# Altium footprint library smd-ipc.PCBLIB: 363 footprints (part 15 of 27) (continued)
## SQFP-R-07X10-92 [mm] (continued)
  rectangle: -6.1,-1.12 -4.95,-0.98
  rectangle: -6.1,-1.42 -4.95,-1.28
  rectangle: -6.1,-1.72 -4.95,-1.58
  rectangle: -6.1,-2.02 -4.95,-1.88
  rectangle: -6.1,-2.32 -4.95,-2.18
  rectangle: -6.1,-2.62 -4.95,-2.48
  lines w0.203: -4.9,-3.4 4.9,-3.4 4.9,3.4 -4.9,3.4 -4.9,-3.4
Mechanical 27:
  lines w0.2: -6.9,-5.4 -6.9,5.4 6.9,5.4 6.9,-5.4 -6.9,-5.4

## SQFP-R-07X10-100 [mm]
pads (100):
  rect 0.17x1.6 smd: 1(-4.35,-4.1) 2(-4.05,-4.1) 3(-3.75,-4.1) 4(-3.45,-4.1) 5(-3.15,-4.1) 6(-2.85,-4.1) 7(-2.55,-4.1) 8(-2.25,-4.1) 9(-1.95,-4.1) 10(-1.65,-4.1) 11(-1.35,-4.1) 12(-1.05,-4.1) 13(-0.75,-4.1) 14(-0.45,-4.1) 15(-0.15,-4.1) 16(0.15,-4.1) 17(0.45,-4.1) 18(0.75,-4.1) 19(1.05,-4.1) 20(1.35,-4.1) 21(1.65,-4.1) 22(1.95,-4.1) 23(2.25,-4.1) 24(2.55,-4.1) 25(2.85,-4.1) 26(3.15,-4.1) 27(3.45,-4.1) 28(3.75,-4.1) 29(4.05,-4.1) 30(4.35,-4.1) 51(4.35,4.1) 52(4.05,4.1) 53(3.75,4.1) 54(3.45,4.1) 55(3.15,4.1) 56(2.85,4.1) 57(2.55,4.1) 58(2.25,4.1) 59(1.95,4.1) 60(1.65,4.1) 61(1.35,4.1) 62(1.05,4.1) 63(0.75,4.1) 64(0.45,4.1) 65(0.15,4.1) 66(-0.15,4.1) 67(-0.45,4.1) 68(-0.75,4.1) 69(-1.05,4.1) 70(-1.35,4.1) 71(-1.65,4.1) 72(-1.95,4.1) 73(-2.25,4.1) 74(-2.55,4.1) 75(-2.85,4.1) 76(-3.15,4.1) 77(-3.45,4.1) 78(-3.75,4.1) 79(-4.05,4.1) 80(-4.35,4.1)
  rect 1.6x0.17 smd: 31(5.6,-2.85) 32(5.6,-2.55) 33(5.6,-2.25) 34(5.6,-1.95) 35(5.6,-1.65) 36(5.6,-1.35) 37(5.6,-1.05) 38(5.6,-0.75) 39(5.6,-0.45) 40(5.6,-0.15) 41(5.6,0.15) 42(5.6,0.45) 43(5.6,0.75) 44(5.6,1.05) 45(5.6,1.35) 46(5.6,1.65) 47(5.6,1.95) 48(5.6,2.25) 49(5.6,2.55) 50(5.6,2.85) 81(-5.6,2.85) 82(-5.6,2.55) 83(-5.6,2.25) 84(-5.6,1.95) 85(-5.6,1.65) 86(-5.6,1.35) 87(-5.6,1.05) 88(-5.6,0.75) 89(-5.6,0.45) 90(-5.6,0.15) 91(-5.6,-0.15) 92(-5.6,-0.45) 93(-5.6,-0.75) 94(-5.6,-1.05) 95(-5.6,-1.35) 96(-5.6,-1.65) 97(-5.6,-1.95) 98(-5.6,-2.25) 99(-5.6,-2.55) 100(-5.6,-2.85)
Top Overlay:
  circle w0.254: c-3.5,-2 r0.75
  lines w0.203: -4.57,-3.06 4.56,-3.06 4.56,3.06 -4.57,3.06 -4.57,-3.06
Mechanical 16:
  rectangle: -4.42,-4.6 -4.28,-3.45
  rectangle: 4.95,-2.92 6.1,-2.78
  rectangle: -4.12,-4.6 -3.98,-3.45
  rectangle: -3.82,-4.6 -3.68,-3.45
  rectangle: -3.52,-4.6 -3.38,-3.45
  rectangle: -3.22,-4.6 -3.08,-3.45
  rectangle: -2.92,-4.6 -2.78,-3.45
  rectangle: -2.62,-4.6 -2.48,-3.45
  rectangle: -2.32,-4.6 -2.18,-3.45
  rectangle: -2.02,-4.6 -1.88,-3.45
  rectangle: -1.72,-4.6 -1.58,-3.45
  rectangle: -1.42,-4.6 -1.28,-3.45
  rectangle: -1.12,-4.6 -0.98,-3.45
  rectangle: -0.82,-4.6 -0.68,-3.45
  rectangle: -0.52,-4.6 -0.38,-3.45
  rectangle: -0.22,-4.6 -0.08,-3.45
  rectangle: 0.08,-4.6 0.22,-3.45
  rectangle: 0.38,-4.6 0.52,-3.45
  rectangle: 0.68,-4.6 0.82,-3.45
  rectangle: 0.98,-4.6 1.12,-3.45
  rectangle: 1.28,-4.6 1.42,-3.45
  rectangle: 1.58,-4.6 1.72,-3.45
  rectangle: 1.88,-4.6 2.02,-3.45
  rectangle: 2.18,-4.6 2.32,-3.45
  rectangle: 2.48,-4.6 2.62,-3.45
  rectangle: 2.78,-4.6 2.92,-3.45
  rectangle: 3.08,-4.6 3.22,-3.45
  rectangle: 3.38,-4.6 3.52,-3.45
  rectangle: 3.68,-4.6 3.82,-3.45
  rectangle: 3.98,-4.6 4.12,-3.45
  rectangle: 4.28,-4.6 4.42,-3.45
  rectangle: 4.95,-2.62 6.1,-2.48
  rectangle: 4.95,-2.32 6.1,-2.18
  rectangle: 4.95,-2.02 6.1,-1.88
  rectangle: 4.95,-1.72 6.1,-1.58
  rectangle: 4.95,-1.42 6.1,-1.28
  rectangle: 4.95,-1.12 6.1,-0.98
  rectangle: 4.95,-0.82 6.1,-0.68
  rectangle: 4.95,-0.52 6.1,-0.38
  rectangle: 4.95,-0.22 6.1,-0.08
  rectangle: 4.95,0.08 6.1,0.22
  rectangle: 4.95,0.38 6.1,0.52
  rectangle: 4.95,0.68 6.1,0.82
  rectangle: 4.95,0.98 6.1,1.12
  rectangle: 4.95,1.28 6.1,1.42
  rectangle: 4.95,1.58 6.1,1.72
  rectangle: 4.95,1.88 6.1,2.02
  rectangle: 4.95,2.18 6.1,2.32
  rectangle: 4.95,2.48 6.1,2.62
  rectangle: 4.95,2.78 6.1,2.92
  rectangle: 4.28,3.45 4.42,4.6
  rectangle: 3.98,3.45 4.12,4.6
  rectangle: 3.68,3.45 3.82,4.6
  rectangle: 3.38,3.45 3.52,4.6
  rectangle: 3.08,3.45 3.22,4.6
  rectangle: 2.78,3.45 2.92,4.6
  rectangle: 2.48,3.45 2.62,4.6
  rectangle: 2.18,3.45 2.32,4.6
  rectangle: 1.88,3.45 2.02,4.6
  rectangle: 1.58,3.45 1.72,4.6
  rectangle: 1.28,3.45 1.42,4.6
  rectangle: 0.98,3.45 1.12,4.6
  rectangle: 0.68,3.45 0.82,4.6
  rectangle: 0.38,3.45 0.52,4.6
  rectangle: 0.08,3.45 0.22,4.6
  rectangle: -0.22,3.45 -0.08,4.6
  rectangle: -0.52,3.45 -0.38,4.6
  rectangle: -0.82,3.45 -0.68,4.6
  rectangle: -1.12,3.45 -0.98,4.6
  rectangle: -1.42,3.45 -1.28,4.6
  rectangle: -1.72,3.45 -1.58,4.6
  rectangle: -2.02,3.45 -1.88,4.6
  rectangle: -2.32,3.45 -2.18,4.6
  rectangle: -2.62,3.45 -2.48,4.6
  rectangle: -2.92,3.45 -2.78,4.6
  rectangle: -3.22,3.45 -3.08,4.6
  rectangle: -3.52,3.45 -3.38,4.6
  rectangle: -3.82,3.45 -3.68,4.6
  rectangle: -4.12,3.45 -3.98,4.6
  rectangle: -4.42,3.45 -4.28,4.6
  rectangle: -6.1,2.78 -4.95,2.92
  rectangle: -6.1,2.48 -4.95,2.62
  rectangle: -6.1,2.18 -4.95,2.32
  rectangle: -6.1,1.88 -4.95,2.02
  rectangle: -6.1,1.58 -4.95,1.72
  rectangle: -6.1,1.28 -4.95,1.42
  rectangle: -6.1,0.98 -4.95,1.12
  rectangle: -6.1,0.68 -4.95,0.82
  rectangle: -6.1,0.38 -4.95,0.52
  rectangle: -6.1,0.08 -4.95,0.22
  rectangle: -6.1,-0.22 -4.95,-0.08
  rectangle: -6.1,-0.52 -4.95,-0.38
  rectangle: -6.1,-0.82 -4.95,-0.68
  rectangle: -6.1,-1.12 -4.95,-0.98
  rectangle: -6.1,-1.42 -4.95,-1.28
  rectangle: -6.1,-1.72 -4.95,-1.58
  rectangle: -6.1,-2.02 -4.95,-1.88
  rectangle: -6.1,-2.32 -4.95,-2.18
  rectangle: -6.1,-2.62 -4.95,-2.48
  rectangle: -6.1,-2.92 -4.95,-2.78
  lines w0.203: -4.9,-3.4 4.9,-3.4 4.9,3.4 -4.9,3.4 -4.9,-3.4
Mechanical 27:
  lines w0.2: -6.9,-5.4 -6.9,5.4 6.9,5.4 6.9,-5.4 -6.9,-5.4

## SQFP-R-10X14-80 [mm]
pads (80):
  rect 0.3x1.6 smd: 1(-5.75,-5.6) 2(-5.25,-5.6) 3(-4.75,-5.6) 4(-4.25,-5.6) 5(-3.75,-5.6) 6(-3.25,-5.6) 7(-2.75,-5.6) 8(-2.25,-5.6) 9(-1.75,-5.6) 10(-1.25,-5.6) 11(-0.75,-5.6) 12(-0.25,-5.6) 13(0.25,-5.6) 14(0.75,-5.6) 15(1.25,-5.6) 16(1.75,-5.6) 17(2.25,-5.6) 18(2.75,-5.6) 19(3.25,-5.6) 20(3.75,-5.6) 21(4.25,-5.6) 22(4.75,-5.6) 23(5.25,-5.6) 24(5.75,-5.6) 41(5.75,5.6) 42(5.25,5.6) 43(4.75,5.6) 44(4.25,5.6) 45(3.75,5.6) 46(3.25,5.6) 47(2.75,5.6) 48(2.25,5.6) 49(1.75,5.6) 50(1.25,5.6) 51(0.75,5.6) 52(0.25,5.6) 53(-0.25,5.6) 54(-0.75,5.6) 55(-1.25,5.6) 56(-1.75,5.6) 57(-2.25,5.6) 58(-2.75,5.6) 59(-3.25,5.6) 60(-3.75,5.6) 61(-4.25,5.6) 62(-4.75,5.6) 63(-5.25,5.6) 64(-5.75,5.6)
  rect 1.6x0.3 smd: 25(7.6,-3.75) 26(7.6,-3.25) 27(7.6,-2.75) 28(7.6,-2.25) 29(7.6,-1.75) 30(7.6,-1.25) 31(7.6,-0.75) 32(7.6,-0.25) 33(7.6,0.25) 34(7.6,0.75) 35(7.6,1.25) 36(7.6,1.75) 37(7.6,2.25) 38(7.6,2.75) 39(7.6,3.25) 40(7.6,3.75) 65(-7.6,3.75) 66(-7.6,3.25) 67(-7.6,2.75) 68(-7.6,2.25) 69(-7.6,1.75) 70(-7.6,1.25) 71(-7.6,0.75) 72(-7.6,0.25) 73(-7.6,-0.25) 74(-7.6,-0.75) 75(-7.6,-1.25) 76(-7.6,-1.75) 77(-7.6,-2.25) 78(-7.6,-2.75) 79(-7.6,-3.25) 80(-7.6,-3.75)
Top Overlay:
  circle w0.254: c-5.5,-3.5 r0.75
  lines w0.203: -6.57,-4.56 6.56,-4.56 6.56,4.56 -6.57,4.56 -6.57,-4.56
Mechanical 16:
  rectangle: -5.9,-6.1 -5.6,-4.95
  rectangle: 6.95,-3.9 8.1,-3.6
  rectangle: -5.4,-6.1 -5.1,-4.95
  rectangle: -4.9,-6.1 -4.6,-4.95
  rectangle: -4.4,-6.1 -4.1,-4.95
  rectangle: -3.9,-6.1 -3.6,-4.95
  rectangle: -3.4,-6.1 -3.1,-4.95
  rectangle: -2.9,-6.1 -2.6,-4.95
  rectangle: -2.4,-6.1 -2.1,-4.95
  rectangle: -1.9,-6.1 -1.6,-4.95
  rectangle: -1.4,-6.1 -1.1,-4.95
  rectangle: -0.9,-6.1 -0.6,-4.95
  rectangle: -0.4,-6.1 -0.1,-4.95
  rectangle: 0.1,-6.1 0.4,-4.95
  rectangle: 0.6,-6.1 0.9,-4.95
  rectangle: 1.1,-6.1 1.4,-4.95
  rectangle: 1.6,-6.1 1.9,-4.95
  rectangle: 2.1,-6.1 2.4,-4.95
  rectangle: 2.6,-6.1 2.9,-4.95
  rectangle: 3.1,-6.1 3.4,-4.95
  rectangle: 3.6,-6.1 3.9,-4.95
  rectangle: 4.1,-6.1 4.4,-4.95
  rectangle: 4.6,-6.1 4.9,-4.95
  rectangle: 5.1,-6.1 5.4,-4.95
  rectangle: 5.6,-6.1 5.9,-4.95
  rectangle: 6.95,-3.4 8.1,-3.1
  rectangle: 6.95,-2.9 8.1,-2.6
  rectangle: 6.95,-2.4 8.1,-2.1
  rectangle: 6.95,-1.9 8.1,-1.6
  rectangle: 6.95,-1.4 8.1,-1.1
  rectangle: 6.95,-0.9 8.1,-0.6
  rectangle: 6.95,-0.4 8.1,-0.1
  rectangle: 6.95,0.1 8.1,0.4
  rectangle: 6.95,0.6 8.1,0.9
  rectangle: 6.95,1.1 8.1,1.4
  rectangle: 6.95,1.6 8.1,1.9
  rectangle: 6.95,2.1 8.1,2.4
  rectangle: 6.95,2.6 8.1,2.9
  rectangle: 6.95,3.1 8.1,3.4
  rectangle: 6.95,3.6 8.1,3.9
  rectangle: 5.6,4.95 5.9,6.1
  rectangle: 5.1,4.95 5.4,6.1
  rectangle: 4.6,4.95 4.9,6.1
  rectangle: 4.1,4.95 4.4,6.1
  rectangle: 3.6,4.95 3.9,6.1
  rectangle: 3.1,4.95 3.4,6.1
  rectangle: 2.6,4.95 2.9,6.1
  rectangle: 2.1,4.95 2.4,6.1
  rectangle: 1.6,4.95 1.9,6.1
  rectangle: 1.1,4.95 1.4,6.1
  rectangle: 0.6,4.95 0.9,6.1
  rectangle: 0.1,4.95 0.4,6.1
  rectangle: -0.4,4.95 -0.1,6.1
  rectangle: -0.9,4.95 -0.6,6.1
  rectangle: -1.4,4.95 -1.1,6.1
  rectangle: -1.9,4.95 -1.6,6.1
  rectangle: -2.4,4.95 -2.1,6.1
  rectangle: -2.9,4.95 -2.6,6.1
  rectangle: -3.4,4.95 -3.1,6.1
  rectangle: -3.9,4.95 -3.6,6.1
  rectangle: -4.4,4.95 -4.1,6.1
  rectangle: -4.9,4.95 -4.6,6.1
  rectangle: -5.4,4.95 -5.1,6.1
  rectangle: -5.9,4.95 -5.6,6.1
  rectangle: -8.1,3.6 -6.95,3.9
  rectangle: -8.1,3.1 -6.95,3.4
  rectangle: -8.1,2.6 -6.95,2.9
  rectangle: -8.1,2.1 -6.95,2.4
  rectangle: -8.1,1.6 -6.95,1.9
  rectangle: -8.1,1.1 -6.95,1.4
  rectangle: -8.1,0.6 -6.95,0.9
  rectangle: -8.1,0.1 -6.95,0.4
  rectangle: -8.1,-0.4 -6.95,-0.1
  rectangle: -8.1,-0.9 -6.95,-0.6
  rectangle: -8.1,-1.4 -6.95,-1.1
  rectangle: -8.1,-1.9 -6.95,-1.6
  rectangle: -8.1,-2.4 -6.95,-2.1
  rectangle: -8.1,-2.9 -6.95,-2.6
  rectangle: -8.1,-3.4 -6.95,-3.1
  rectangle: -8.1,-3.9 -6.95,-3.6
  lines w0.203: -6.9,-4.9 6.9,-4.9 6.9,4.9 -6.9,4.9 -6.9,-4.9
Mechanical 27:
  lines w0.2: -8.9,-6.9 -8.9,6.9 8.9,6.9 8.9,-6.9 -8.9,-6.9

## SQFP-R-10X14-88 [mm]
pads (88):
  rect 0.3x1.6 smd: 1(-6.25,-5.6) 2(-5.75,-5.6) 3(-5.25,-5.6) 4(-4.75,-5.6) 5(-4.25,-5.6) 6(-3.75,-5.6) 7(-3.25,-5.6) 8(-2.75,-5.6) 9(-2.25,-5.6) 10(-1.75,-5.6) 11(-1.25,-5.6) 12(-0.75,-5.6) 13(-0.25,-5.6) 14(0.25,-5.6) 15(0.75,-5.6) 16(1.25,-5.6) 17(1.75,-5.6) 18(2.25,-5.6) 19(2.75,-5.6) 20(3.25,-5.6) 21(3.75,-5.6) 22(4.25,-5.6) 23(4.75,-5.6) 24(5.25,-5.6) 25(5.75,-5.6) 26(6.25,-5.6) 45(6.25,5.6) 46(5.75,5.6) 47(5.25,5.6) 48(4.75,5.6) 49(4.25,5.6) 50(3.75,5.6) 51(3.25,5.6) 52(2.75,5.6) 53(2.25,5.6) 54(1.75,5.6) 55(1.25,5.6) 56(0.75,5.6) 57(0.25,5.6) 58(-0.25,5.6) 59(-0.75,5.6) 60(-1.25,5.6) 61(-1.75,5.6) 62(-2.25,5.6) 63(-2.75,5.6) 64(-3.25,5.6) 65(-3.75,5.6) 66(-4.25,5.6) 67(-4.75,5.6) 68(-5.25,5.6) 69(-5.75,5.6) 70(-6.25,5.6)
  rect 1.6x0.3 smd: 27(7.6,-4.25) 28(7.6,-3.75) 29(7.6,-3.25) 30(7.6,-2.75) 31(7.6,-2.25) 32(7.6,-1.75) 33(7.6,-1.25) 34(7.6,-0.75) 35(7.6,-0.25) 36(7.6,0.25) 37(7.6,0.75) 38(7.6,1.25) 39(7.6,1.75) 40(7.6,2.25) 41(7.6,2.75) 42(7.6,3.25) 43(7.6,3.75) 44(7.6,4.25) 71(-7.6,4.25) 72(-7.6,3.75) 73(-7.6,3.25) 74(-7.6,2.75) 75(-7.6,2.25) 76(-7.6,1.75) 77(-7.6,1.25) 78(-7.6,0.75) 79(-7.6,0.25) 80(-7.6,-0.25) 81(-7.6,-0.75) 82(-7.6,-1.25) 83(-7.6,-1.75) 84(-7.6,-2.25) 85(-7.6,-2.75) 86(-7.6,-3.25) 87(-7.6,-3.75) 88(-7.6,-4.25)
Top Overlay:
  circle w0.254: c-5.5,-3.5 r0.75
  lines w0.203: -6.57,-4.56 6.56,-4.56 6.56,4.56 -6.57,4.56 -6.57,-4.56
Mechanical 16:
  rectangle: -6.4,-6.1 -6.1,-4.95
  rectangle: 6.95,-4.4 8.1,-4.1
  rectangle: -5.9,-6.1 -5.6,-4.95
  rectangle: -5.4,-6.1 -5.1,-4.95
  rectangle: -4.9,-6.1 -4.6,-4.95
  rectangle: -4.4,-6.1 -4.1,-4.95
  rectangle: -3.9,-6.1 -3.6,-4.95
  rectangle: -3.4,-6.1 -3.1,-4.95
  rectangle: -2.9,-6.1 -2.6,-4.95
  rectangle: -2.4,-6.1 -2.1,-4.95
  rectangle: -1.9,-6.1 -1.6,-4.95
  rectangle: -1.4,-6.1 -1.1,-4.95
  rectangle: -0.9,-6.1 -0.6,-4.95
  rectangle: -0.4,-6.1 -0.1,-4.95
  rectangle: 0.1,-6.1 0.4,-4.95
  rectangle: 0.6,-6.1 0.9,-4.95
  rectangle: 1.1,-6.1 1.4,-4.95
  rectangle: 1.6,-6.1 1.9,-4.95
  rectangle: 2.1,-6.1 2.4,-4.95
  rectangle: 2.6,-6.1 2.9,-4.95
  rectangle: 3.1,-6.1 3.4,-4.95
  rectangle: 3.6,-6.1 3.9,-4.95
  rectangle: 4.1,-6.1 4.4,-4.95
  rectangle: 4.6,-6.1 4.9,-4.95
  rectangle: 5.1,-6.1 5.4,-4.95
  rectangle: 5.6,-6.1 5.9,-4.95
  rectangle: 6.1,-6.1 6.4,-4.95
  rectangle: 6.95,-3.9 8.1,-3.6
  rectangle: 6.95,-3.4 8.1,-3.1
  rectangle: 6.95,-2.9 8.1,-2.6
  rectangle: 6.95,-2.4 8.1,-2.1
  rectangle: 6.95,-1.9 8.1,-1.6
  rectangle: 6.95,-1.4 8.1,-1.1
  rectangle: 6.95,-0.9 8.1,-0.6
  rectangle: 6.95,-0.4 8.1,-0.1
  rectangle: 6.95,0.1 8.1,0.4
  rectangle: 6.95,0.6 8.1,0.9
  rectangle: 6.95,1.1 8.1,1.4
  rectangle: 6.95,1.6 8.1,1.9
  rectangle: 6.95,2.1 8.1,2.4
  rectangle: 6.95,2.6 8.1,2.9
  rectangle: 6.95,3.1 8.1,3.4
  rectangle: 6.95,3.6 8.1,3.9
  rectangle: 6.95,4.1 8.1,4.4
  rectangle: 6.1,4.95 6.4,6.1
  rectangle: 5.6,4.95 5.9,6.1
  rectangle: 5.1,4.95 5.4,6.1
  rectangle: 4.6,4.95 4.9,6.1
  rectangle: 4.1,4.95 4.4,6.1
  rectangle: 3.6,4.95 3.9,6.1
  rectangle: 3.1,4.95 3.4,6.1
  rectangle: 2.6,4.95 2.9,6.1
  rectangle: 2.1,4.95 2.4,6.1
  rectangle: 1.6,4.95 1.9,6.1
  rectangle: 1.1,4.95 1.4,6.1
  rectangle: 0.6,4.95 0.9,6.1
  rectangle: 0.1,4.95 0.4,6.1
  rectangle: -0.4,4.95 -0.1,6.1
  rectangle: -0.9,4.95 -0.6,6.1
  rectangle: -1.4,4.95 -1.1,6.1
  rectangle: -1.9,4.95 -1.6,6.1
  rectangle: -2.4,4.95 -2.1,6.1
  rectangle: -2.9,4.95 -2.6,6.1
  rectangle: -3.4,4.95 -3.1,6.1
  rectangle: -3.9,4.95 -3.6,6.1
  rectangle: -4.4,4.95 -4.1,6.1
  rectangle: -4.9,4.95 -4.6,6.1
  rectangle: -5.4,4.95 -5.1,6.1
  rectangle: -5.9,4.95 -5.6,6.1
  rectangle: -6.4,4.95 -6.1,6.1
  rectangle: -8.1,4.1 -6.95,4.4
  rectangle: -8.1,3.6 -6.95,3.9
  rectangle: -8.1,3.1 -6.95,3.4
  rectangle: -8.1,2.6 -6.95,2.9
  rectangle: -8.1,2.1 -6.95,2.4
  rectangle: -8.1,1.6 -6.95,1.9
  rectangle: -8.1,1.1 -6.95,1.4
  rectangle: -8.1,0.6 -6.95,0.9
  rectangle: -8.1,0.1 -6.95,0.4
  rectangle: -8.1,-0.4 -6.95,-0.1
  rectangle: -8.1,-0.9 -6.95,-0.6
  rectangle: -8.1,-1.4 -6.95,-1.1
  rectangle: -8.1,-1.9 -6.95,-1.6
  rectangle: -8.1,-2.4 -6.95,-2.1
  rectangle: -8.1,-2.9 -6.95,-2.6
  rectangle: -8.1,-3.4 -6.95,-3.1
  rectangle: -8.1,-3.9 -6.95,-3.6
  rectangle: -8.1,-4.4 -6.95,-4.1
  lines w0.203: -6.9,-4.9 6.9,-4.9 6.9,4.9 -6.9,4.9 -6.9,-4.9
Mechanical 27:
  lines w0.2: -8.9,-6.9 -8.9,6.9 8.9,6.9 8.9,-6.9 -8.9,-6.9

## SQFP-R-10X14-100 [mm]
pads (100):
  rect 0.25x1.6 smd: 1(-5.8,-5.6) 2(-5.4,-5.6) 3(-5,-5.6) 4(-4.6,-5.6) 5(-4.2,-5.6) 6(-3.8,-5.6) 7(-3.4,-5.6) 8(-3,-5.6) 9(-2.6,-5.6) 10(-2.2,-5.6) 11(-1.8,-5.6) 12(-1.4,-5.6) 13(-1,-5.6) 14(-0.6,-5.6) 15(-0.2,-5.6) 16(0.2,-5.6) 17(0.6,-5.6) 18(1,-5.6) 19(1.4,-5.6) 20(1.8,-5.6) 21(2.2,-5.6) 22(2.6,-5.6) 23(3,-5.6) 24(3.4,-5.6) 25(3.8,-5.6) 26(4.2,-5.6) 27(4.6,-5.6) 28(5,-5.6) 29(5.4,-5.6) 30(5.8,-5.6) 51(5.8,5.6) 52(5.4,5.6) 53(5,5.6) 54(4.6,5.6) 55(4.2,5.6) 56(3.8,5.6) 57(3.4,5.6) 58(3,5.6) 59(2.6,5.6) 60(2.2,5.6) 61(1.8,5.6) 62(1.4,5.6) 63(1,5.6) 64(0.6,5.6) 65(0.2,5.6) 66(-0.2,5.6) 67(-0.6,5.6) 68(-1,5.6) 69(-1.4,5.6) 70(-1.8,5.6) 71(-2.2,5.6) 72(-2.6,5.6) 73(-3,5.6) 74(-3.4,5.6) 75(-3.8,5.6) 76(-4.2,5.6) 77(-4.6,5.6) 78(-5,5.6) 79(-5.4,5.6) 80(-5.8,5.6)
  rect 1.6x0.25 smd: 31(7.6,-3.8) 32(7.6,-3.4) 33(7.6,-3) 34(7.6,-2.6) 35(7.6,-2.2) 36(7.6,-1.8) 37(7.6,-1.4) 38(7.6,-1) 39(7.6,-0.6) 40(7.6,-0.2) 41(7.6,0.2) 42(7.6,0.6) 43(7.6,1) 44(7.6,1.4) 45(7.6,1.8) 46(7.6,2.2) 47(7.6,2.6) 48(7.6,3) 49(7.6,3.4) 50(7.6,3.8) 81(-7.6,3.8) 82(-7.6,3.4) 83(-7.6,3) 84(-7.6,2.6) 85(-7.6,2.2) 86(-7.6,1.8) 87(-7.6,1.4) 88(-7.6,1) 89(-7.6,0.6) 90(-7.6,0.2) 91(-7.6,-0.2) 92(-7.6,-0.6) 93(-7.6,-1) 94(-7.6,-1.4) 95(-7.6,-1.8) 96(-7.6,-2.2) 97(-7.6,-2.6) 98(-7.6,-3) 99(-7.6,-3.4) 100(-7.6,-3.8)
Top Overlay:
  circle w0.254: c-5.5,-3.5 r0.75
  lines w0.203: -6.57,-4.56 6.56,-4.56 6.56,4.56 -6.57,4.56 -6.57,-4.56
Mechanical 16:
  rectangle: -5.91,-6.1 -5.69,-4.95
  rectangle: 6.95,-3.91 8.1,-3.69
  rectangle: -5.51,-6.1 -5.29,-4.95
  rectangle: -5.11,-6.1 -4.89,-4.95
  rectangle: -4.71,-6.1 -4.49,-4.95
  rectangle: -4.31,-6.1 -4.09,-4.95
  rectangle: -3.91,-6.1 -3.69,-4.95
  rectangle: -3.51,-6.1 -3.29,-4.95
  rectangle: -3.11,-6.1 -2.89,-4.95
  rectangle: -2.71,-6.1 -2.49,-4.95
  rectangle: -2.31,-6.1 -2.09,-4.95
  rectangle: -1.91,-6.1 -1.69,-4.95
  rectangle: -1.51,-6.1 -1.29,-4.95
  rectangle: -1.11,-6.1 -0.89,-4.95
  rectangle: -0.71,-6.1 -0.49,-4.95
  rectangle: -0.31,-6.1 -0.09,-4.95
  rectangle: 0.09,-6.1 0.31,-4.95
  rectangle: 0.49,-6.1 0.71,-4.95
  rectangle: 0.89,-6.1 1.11,-4.95
  rectangle: 1.29,-6.1 1.51,-4.95
  rectangle: 1.69,-6.1 1.91,-4.95
  rectangle: 2.09,-6.1 2.31,-4.95
  rectangle: 2.49,-6.1 2.71,-4.95
  rectangle: 2.89,-6.1 3.11,-4.95
  rectangle: 3.29,-6.1 3.51,-4.95
  rectangle: 3.69,-6.1 3.91,-4.95
  rectangle: 4.09,-6.1 4.31,-4.95
  rectangle: 4.49,-6.1 4.71,-4.95
  rectangle: 4.89,-6.1 5.11,-4.95
  rectangle: 5.29,-6.1 5.51,-4.95
  rectangle: 5.69,-6.1 5.91,-4.95
  rectangle: 6.95,-3.51 8.1,-3.29
  rectangle: 6.95,-3.11 8.1,-2.89
  rectangle: 6.95,-2.71 8.1,-2.49
  rectangle: 6.95,-2.31 8.1,-2.09
  rectangle: 6.95,-1.91 8.1,-1.69
  rectangle: 6.95,-1.51 8.1,-1.29
  rectangle: 6.95,-1.11 8.1,-0.89
  rectangle: 6.95,-0.71 8.1,-0.49
  rectangle: 6.95,-0.31 8.1,-0.09
  rectangle: 6.95,0.09 8.1,0.31
  rectangle: 6.95,0.49 8.1,0.71
  rectangle: 6.95,0.89 8.1,1.11
  rectangle: 6.95,1.29 8.1,1.51
  rectangle: 6.95,1.69 8.1,1.91
  rectangle: 6.95,2.09 8.1,2.31
  rectangle: 6.95,2.49 8.1,2.71
  rectangle: 6.95,2.89 8.1,3.11
  rectangle: 6.95,3.29 8.1,3.51
  rectangle: 6.95,3.69 8.1,3.91
  rectangle: 5.69,4.95 5.91,6.1
  rectangle: 5.29,4.95 5.51,6.1
  rectangle: 4.89,4.95 5.11,6.1
  rectangle: 4.49,4.95 4.71,6.1
  rectangle: 4.09,4.95 4.31,6.1
  rectangle: 3.69,4.95 3.91,6.1
  rectangle: 3.29,4.95 3.51,6.1
  rectangle: 2.89,4.95 3.11,6.1
  rectangle: 2.49,4.95 2.71,6.1
  rectangle: 2.09,4.95 2.31,6.1
  rectangle: 1.69,4.95 1.91,6.1
  rectangle: 1.29,4.95 1.51,6.1
  rectangle: 0.89,4.95 1.11,6.1
  rectangle: 0.49,4.95 0.71,6.1
  rectangle: 0.09,4.95 0.31,6.1
  rectangle: -0.31,4.95 -0.09,6.1
  rectangle: -0.71,4.95 -0.49,6.1
  rectangle: -1.11,4.95 -0.89,6.1
  rectangle: -1.51,4.95 -1.29,6.1
  rectangle: -1.91,4.95 -1.69,6.1
  rectangle: -2.31,4.95 -2.09,6.1
  rectangle: -2.71,4.95 -2.49,6.1
  rectangle: -3.11,4.95 -2.89,6.1
  rectangle: -3.51,4.95 -3.29,6.1
  rectangle: -3.91,4.95 -3.69,6.1
  rectangle: -4.31,4.95 -4.09,6.1
  rectangle: -4.71,4.95 -4.49,6.1
  rectangle: -5.11,4.95 -4.89,6.1
  rectangle: -5.51,4.95 -5.29,6.1
  rectangle: -5.91,4.95 -5.69,6.1
  rectangle: -8.1,3.69 -6.95,3.91
  rectangle: -8.1,3.29 -6.95,3.51
  rectangle: -8.1,2.89 -6.95,3.11
  rectangle: -8.1,2.49 -6.95,2.71
  rectangle: -8.1,2.09 -6.95,2.31
  rectangle: -8.1,1.69 -6.95,1.91
  rectangle: -8.1,1.29 -6.95,1.51
  rectangle: -8.1,0.89 -6.95,1.11
  rectangle: -8.1,0.49 -6.95,0.71
  rectangle: -8.1,0.09 -6.95,0.31
  rectangle: -8.1,-0.31 -6.95,-0.09
  rectangle: -8.1,-0.71 -6.95,-0.49
  rectangle: -8.1,-1.11 -6.95,-0.89
  rectangle: -8.1,-1.51 -6.95,-1.29
  rectangle: -8.1,-1.91 -6.95,-1.69
  rectangle: -8.1,-2.31 -6.95,-2.09
  rectangle: -8.1,-2.71 -6.95,-2.49
  rectangle: -8.1,-3.11 -6.95,-2.89
  rectangle: -8.1,-3.51 -6.95,-3.29
  rectangle: -8.1,-3.91 -6.95,-3.69
  lines w0.203: -6.9,-4.9 6.9,-4.9 6.9,4.9 -6.9,4.9 -6.9,-4.9
Mechanical 27:
  lines w0.2: -8.9,-6.9 -8.9,6.9 8.9,6.9 8.9,-6.9 -8.9,-6.9

## SQFP-R-10X14-108 [mm]
pads (108):
  rect 0.25x1.6 smd: 1(-6.2,-5.6) 2(-5.8,-5.6) 3(-5.4,-5.6) 4(-5,-5.6) 5(-4.6,-5.6) 6(-4.2,-5.6) 7(-3.8,-5.6) 8(-3.4,-5.6) 9(-3,-5.6) 10(-2.6,-5.6) 11(-2.2,-5.6) 12(-1.8,-5.6) 13(-1.4,-5.6) 14(-1,-5.6) 15(-0.6,-5.6) 16(-0.2,-5.6) 17(0.2,-5.6) 18(0.6,-5.6) 19(1,-5.6) 20(1.4,-5.6) 21(1.8,-5.6) 22(2.2,-5.6) 23(2.6,-5.6) 24(3,-5.6) 25(3.4,-5.6) 26(3.8,-5.6) 27(4.2,-5.6) 28(4.6,-5.6) 29(5,-5.6) 30(5.4,-5.6) 31(5.8,-5.6) 32(6.2,-5.6) 55(6.2,5.6) 56(5.8,5.6) 57(5.4,5.6) 58(5,5.6) 59(4.6,5.6) 60(4.2,5.6) 61(3.8,5.6) 62(3.4,5.6) 63(3,5.6) 64(2.6,5.6) 65(2.2,5.6) 66(1.8,5.6) 67(1.4,5.6) 68(1,5.6) 69(0.6,5.6) 70(0.2,5.6) 71(-0.2,5.6) 72(-0.6,5.6) 73(-1,5.6) 74(-1.4,5.6) 75(-1.8,5.6) 76(-2.2,5.6) 77(-2.6,5.6) 78(-3,5.6) 79(-3.4,5.6) 80(-3.8,5.6) 81(-4.2,5.6) 82(-4.6,5.6) 83(-5,5.6) 84(-5.4,5.6) 85(-5.8,5.6) 86(-6.2,5.6)
  rect 1.6x0.25 smd: 33(7.6,-4.2) 34(7.6,-3.8) 35(7.6,-3.4) 36(7.6,-3) 37(7.6,-2.6) 38(7.6,-2.2) 39(7.6,-1.8) 40(7.6,-1.4) 41(7.6,-1) 42(7.6,-0.6) 43(7.6,-0.2) 44(7.6,0.2) 45(7.6,0.6) 46(7.6,1) 47(7.6,1.4) 48(7.6,1.8) 49(7.6,2.2) 50(7.6,2.6) 51(7.6,3) 52(7.6,3.4) 53(7.6,3.8) 54(7.6,4.2) 87(-7.6,4.2) 88(-7.6,3.8) 89(-7.6,3.4) 90(-7.6,3) 91(-7.6,2.6) 92(-7.6,2.2) 93(-7.6,1.8) 94(-7.6,1.4) 95(-7.6,1) 96(-7.6,0.6) 97(-7.6,0.2) 98(-7.6,-0.2) 99(-7.6,-0.6) 100(-7.6,-1) 101(-7.6,-1.4) 102(-7.6,-1.8) 103(-7.6,-2.2) 104(-7.6,-2.6) 105(-7.6,-3) 106(-7.6,-3.4) 107(-7.6,-3.8) 108(-7.6,-4.2)
Top Overlay:
  circle w0.254: c-5.5,-3.5 r0.75
  lines w0.203: -6.57,-4.56 6.56,-4.56 6.56,4.56 -6.57,4.56 -6.57,-4.56
Mechanical 16:
  rectangle: -6.31,-6.1 -6.09,-4.95
  rectangle: 6.95,-4.31 8.1,-4.09
  rectangle: -5.91,-6.1 -5.69,-4.95
  rectangle: -5.51,-6.1 -5.29,-4.95
  rectangle: -5.11,-6.1 -4.89,-4.95
  rectangle: -4.71,-6.1 -4.49,-4.95
  rectangle: -4.31,-6.1 -4.09,-4.95
  rectangle: -3.91,-6.1 -3.69,-4.95
  rectangle: -3.51,-6.1 -3.29,-4.95
  rectangle: -3.11,-6.1 -2.89,-4.95
  rectangle: -2.71,-6.1 -2.49,-4.95
  rectangle: -2.31,-6.1 -2.09,-4.95
  rectangle: -1.91,-6.1 -1.69,-4.95
  rectangle: -1.51,-6.1 -1.29,-4.95
  rectangle: -1.11,-6.1 -0.89,-4.95
  rectangle: -0.71,-6.1 -0.49,-4.95
  rectangle: -0.31,-6.1 -0.09,-4.95
  rectangle: 0.09,-6.1 0.31,-4.95
  rectangle: 0.49,-6.1 0.71,-4.95
  rectangle: 0.89,-6.1 1.11,-4.95
  rectangle: 1.29,-6.1 1.51,-4.95
  rectangle: 1.69,-6.1 1.91,-4.95
  rectangle: 2.09,-6.1 2.31,-4.95
  rectangle: 2.49,-6.1 2.71,-4.95
  rectangle: 2.89,-6.1 3.11,-4.95
  rectangle: 3.29,-6.1 3.51,-4.95
  rectangle: 3.69,-6.1 3.91,-4.95
  rectangle: 4.09,-6.1 4.31,-4.95
  rectangle: 4.49,-6.1 4.71,-4.95
  rectangle: 4.89,-6.1 5.11,-4.95
  rectangle: 5.29,-6.1 5.51,-4.95
  rectangle: 5.69,-6.1 5.91,-4.95
  rectangle: 6.09,-6.1 6.31,-4.95
  rectangle: 6.95,-3.91 8.1,-3.69
  rectangle: 6.95,-3.51 8.1,-3.29
  rectangle: 6.95,-3.11 8.1,-2.89
  rectangle: 6.95,-2.71 8.1,-2.49
  rectangle: 6.95,-2.31 8.1,-2.09
  rectangle: 6.95,-1.91 8.1,-1.69
  rectangle: 6.95,-1.51 8.1,-1.29
  rectangle: 6.95,-1.11 8.1,-0.89
  rectangle: 6.95,-0.71 8.1,-0.49
  rectangle: 6.95,-0.31 8.1,-0.09
  rectangle: 6.95,0.09 8.1,0.31
  rectangle: 6.95,0.49 8.1,0.71
  rectangle: 6.95,0.89 8.1,1.11
  rectangle: 6.95,1.29 8.1,1.51
  rectangle: 6.95,1.69 8.1,1.91
  rectangle: 6.95,2.09 8.1,2.31
  rectangle: 6.95,2.49 8.1,2.71
  rectangle: 6.95,2.89 8.1,3.11
  rectangle: 6.95,3.29 8.1,3.51
  rectangle: 6.95,3.69 8.1,3.91
  rectangle: 6.95,4.09 8.1,4.31
  rectangle: 6.09,4.95 6.31,6.1
  rectangle: 5.69,4.95 5.91,6.1
  rectangle: 5.29,4.95 5.51,6.1
  rectangle: 4.89,4.95 5.11,6.1
  rectangle: 4.49,4.95 4.71,6.1
  rectangle: 4.09,4.95 4.31,6.1
  rectangle: 3.69,4.95 3.91,6.1
  rectangle: 3.29,4.95 3.51,6.1
  rectangle: 2.89,4.95 3.11,6.1
  rectangle: 2.49,4.95 2.71,6.1
  rectangle: 2.09,4.95 2.31,6.1
  rectangle: 1.69,4.95 1.91,6.1
  rectangle: 1.29,4.95 1.51,6.1
  rectangle: 0.89,4.95 1.11,6.1
  rectangle: 0.49,4.95 0.71,6.1
  rectangle: 0.09,4.95 0.31,6.1
  rectangle: -0.31,4.95 -0.09,6.1
  rectangle: -0.71,4.95 -0.49,6.1
  rectangle: -1.11,4.95 -0.89,6.1
  rectangle: -1.51,4.95 -1.29,6.1
  rectangle: -1.91,4.95 -1.69,6.1
  rectangle: -2.31,4.95 -2.09,6.1
  rectangle: -2.71,4.95 -2.49,6.1
  rectangle: -3.11,4.95 -2.89,6.1
  rectangle: -3.51,4.95 -3.29,6.1
  rectangle: -3.91,4.95 -3.69,6.1
  rectangle: -4.31,4.95 -4.09,6.1
  rectangle: -4.71,4.95 -4.49,6.1
  rectangle: -5.11,4.95 -4.89,6.1
  rectangle: -5.51,4.95 -5.29,6.1
  rectangle: -5.91,4.95 -5.69,6.1
  rectangle: -6.31,4.95 -6.09,6.1
  rectangle: -8.1,4.09 -6.95,4.31
  rectangle: -8.1,3.69 -6.95,3.91
  rectangle: -8.1,3.29 -6.95,3.51
  rectangle: -8.1,2.89 -6.95,3.11
  rectangle: -8.1,2.49 -6.95,2.71
  rectangle: -8.1,2.09 -6.95,2.31
  rectangle: -8.1,1.69 -6.95,1.91
  rectangle: -8.1,1.29 -6.95,1.51
  rectangle: -8.1,0.89 -6.95,1.11
  rectangle: -8.1,0.49 -6.95,0.71
  rectangle: -8.1,0.09 -6.95,0.31
  rectangle: -8.1,-0.31 -6.95,-0.09
  rectangle: -8.1,-0.71 -6.95,-0.49
  rectangle: -8.1,-1.11 -6.95,-0.89
  rectangle: -8.1,-1.51 -6.95,-1.29
  rectangle: -8.1,-1.91 -6.95,-1.69
  rectangle: -8.1,-2.31 -6.95,-2.09
  rectangle: -8.1,-2.71 -6.95,-2.49
  rectangle: -8.1,-3.11 -6.95,-2.89
  rectangle: -8.1,-3.51 -6.95,-3.29
  rectangle: -8.1,-3.91 -6.95,-3.69
  rectangle: -8.1,-4.31 -6.95,-4.09
  lines w0.203: -6.9,-4.9 6.9,-4.9 6.9,4.9 -6.9,4.9 -6.9,-4.9
Mechanical 27:
  lines w0.2: -8.9,-6.9 -8.9,6.9 8.9,6.9 8.9,-6.9 -8.9,-6.9